# Altium footprint library Generic Footprint.PcbLib: 160 footprints (part 16 of 20) (continued)
## Symbol_FCC-Logo-6x4mm_Silkscreen [mil] (continued)
1(148.46,108.35) 1(148.73,23.48) 1(148.73,55.61) 1(148.73,140.21) 1(149,55.61) 1(149,56.14) 1(149,108.08) 1(149,108.35) 1(149,108.62) 1(149,140.74) 1(149.27,129.5) 1(149.27,130.03) 1(149.53,34.19) 1(149.53,34.46) 1(149.53,34.73) 1(149.53,108.88) 1(149.53,140.74) 1(149.8,108.35) 1(149.8,108.62) 1(149.8,109.15) 1(149.8,140.74) 1(149.8,162.16) 1(150.07,55.88) 1(150.07,140.74) 1(150.07,161.62) 1(150.07,161.89) 1(150.34,23.75) 1(150.34,55.61) 1(150.34,108.62) 1(150.34,108.88) 1(150.34,109.15) 1(150.34,140.48) 1(150.34,141.01) 1(150.34,141.28) 1(150.61,2.07) 1(150.61,2.33) 1(150.61,2.6) 1(150.61,54.81) 1(150.61,55.34) 1(150.61,109.42) 1(150.87,108.88) 1(150.87,129.77) 1(150.87,130.3) 1(151.14,33.92) 1(151.14,34.19) 1(151.14,34.46) 1(151.14,109.15) 1(151.14,109.42) 1(151.14,109.69) 1(151.14,129.77) 1(151.41,33.66) 1(151.41,54.54) 1(151.41,54.81) 1(151.41,55.07) 1(151.41,129.77) 1(151.94,109.69) 1(151.94,129.77) 1(151.94,140.74) 1(151.94,141.28) 1(151.94,141.55) 1(152.21,23.48) 1(152.21,54.27) 1(152.21,54.54) 1(152.21,109.42) 1(152.21,109.96) 1(152.21,130.57) 1(152.48,22.68) 1(152.48,23.22) 1(152.48,33.39) 1(152.48,34.19) 1(152.48,54.81) 1(152.48,109.96) 1(152.48,130.03) 1(152.48,161.89) 1(152.48,162.43) 1(152.75,1.8) 1(152.75,2.33) 1(152.75,22.68) 1(152.75,109.96) 1(153.01,2.07) 1(153.01,54) 1(153.01,109.96) 1(153.01,130.03) 1(153.28,22.68) 1(153.28,53.73) 1(153.28,54.27) 1(153.28,54.54) 1(153.55,130.03) 1(153.82,130.03) 1(153.82,130.84) 1(154.09,22.68) 1(154.09,130.57) 1(154.35,22.68) 1(154.35,53.73) 1(154.35,54) 1(154.35,54.27) 1(154.35,109.69) 1(154.35,141.28) 1(154.35,141.55) 1(154.35,141.81) 1(154.62,22.68) 1(154.62,33.12) 1(154.62,53.47) 1(154.89,22.41) 1(154.89,22.95) 1(155.42,53.47) 1(155.69,53.47) 1(155.69,109.96) 1(155.69,162.7) 1(155.96,53.47) 1(155.96,54) 1(155.96,110.22) 1(155.96,110.76) 1(156.23,162.96) 1(156.49,53.2) 1(156.49,130.57) 1(156.49,130.84) 1(156.49,131.11) 1(156.76,53.2) 1(157.03,1.26) 1(157.03,1.53) 1(157.03,1.8) 1(157.03,2.07) 1(157.3,32.85) 1(157.3,33.39) 1(157.3,53.2) 1(157.83,53.2) 1(158.1,53.2) 1(158.1,110.49) 1(158.1,110.76) 1(158.1,111.03) 1(158.37,53.73) 1(158.64,53.2) 1(158.64,141.55) 1(158.9,141.81) 1(158.9,142.08) 1(162.65,141.55) 1(162.92,141.81) 1(162.92,142.08) 1(163.19,53.2) 1(163.19,53.73) 1(163.46,53.2) 1(163.72,110.49) 1(163.72,110.76) 1(163.72,111.03) 1(163.99,32.85) 1(163.99,33.39) 1(163.99,53.2) 1(164.26,1.8) 1(164.53,1.26) 1(164.53,2.07) 1(164.53,53.2) 1(164.79,1.53) 1(164.79,53.2) 1(164.79,130.57) 1(164.79,130.84) 1(165.06,131.11) 1(165.33,53.2) 1(165.33,162.96) 1(165.6,53.47) 1(165.6,54) 1(165.6,162.7) 1(165.87,53.47) 1(165.87,110.22) 1(165.87,110.76) 1(166.13,109.96) 1(166.4,53.47) 1(166.67,22.41) 1(166.67,22.68) 1(166.67,22.95) 1(166.94,22.68) 1(166.94,33.12) 1(166.94,53.47) 1(167.2,22.68) 1(167.2,53.73) 1(167.2,54) 1(167.2,54.27) 1(167.2,141.28) 1(167.2,141.55) 1(167.2,141.81) 1(167.47,130.3) 1(167.47,130.57) 1(167.74,130.03) 1(167.74,130.84) 1(168.01,109.69) 1(168.01,130.3) 1(168.27,22.68) 1(168.27,53.73) 1(168.27,54) 1(168.27,54.27) 1(168.27,54.54) 1(168.27,130.03) 1(168.54,22.68) 1(168.81,1.8) 1(168.81,2.07) 1(168.81,2.33) 1(168.81,22.68) 1(168.81,33.39) 1(168.81,130.03) 1(168.81,161.89) 1(169.08,23.22) 1(169.08,34.19) 1(169.08,109.42) 1(169.08,109.96) 1(169.08,130.03) 1(169.08,162.43) 1(169.35,23.48) 1(169.35,54.27) 1(169.35,54.54) 1(169.35,54.81) 1(169.35,109.42) 1(169.35,130.57) 1(169.61,109.42) 1(169.61,109.96) 1(169.61,129.77) 1(169.61,140.74) 1(169.61,141.28) 1(169.61,141.55) 1(169.88,109.69) 1(169.88,129.77) 1(170.15,54.54) 1(170.15,54.81) 1(170.15,55.07) 1(170.15,129.77) 1(170.42,33.66) 1(170.42,33.92) 1(170.42,34.19) 1(170.42,34.46) 1(170.42,130.03) 1(170.68,109.15) 1(170.68,109.42) 1(170.68,109.69) 1(170.68,129.77) 1(170.68,130.03) 1(170.68,130.3) 1(170.95,23.75) 1(170.95,54.81) 1(170.95,55.07) 1(170.95,55.34) 1(170.95,55.61) 1(171.22,2.33) 1(171.22,2.6) 1(171.22,55.07) 1(171.22,140.48) 1(171.22,141.28) 1(171.22,161.62) 1(171.22,161.89) 1(171.49,2.07) 1(171.49,109.15) 1(171.49,109.42) 1(171.49,141.01) 1(171.49,162.16) 1(171.75,34.46) 1(171.75,55.88) 1(171.75,108.62) 1(172.02,34.19) 1(172.02,34.73) 1(172.02,129.5) 1(172.29,109.15) 1(172.29,130.03) 1(172.29,140.74) 1(172.56,55.61) 1(172.56,56.14) 1(172.56,108.35) 1(172.56,108.62) 1(172.56,108.88) 1(172.56,140.74) 1(172.83,23.48) 1(172.83,55.61) 1(172.83,140.21) 1(173.09,34.46) 1(173.09,34.73) 1(173.09,34.99) 1(173.09,55.88) 1(173.09,56.41) 1(173.09,108.08) 1(173.09,108.35) 1(173.09,108.62) 1(173.09,129.5) 1(173.36,2.6) 1(173.36,2.87) 1(173.36,35.26) 1(173.36,129.23) 1(173.36,129.77) 1(173.36,161.36) 1(173.36,161.62) 1(173.36,161.89) 1(173.63,2.33) 1(173.63,3.14) 1(173.63,24.02) 1(173.63,55.88) 1(173.63,56.14) 1(173.63,107.81) 1(173.63,108.35) 1(173.63,128.96) 1(173.63,161.09) 1(173.9,3.14) 1(173.9,23.48) 1(173.9,23.75) 1(173.9,56.68) 1(174.16,3.14) 1(174.16,34.73) 1(174.16,34.99) 1(174.16,35.26) 1(174.16,56.14) 1(174.16,56.68) 1(174.16,107.55) 1(174.16,128.7) 1(174.16,129.23) 1(174.16,129.5) 1(174.16,140.48) 1(174.43,35.26) 1(174.43,35.53) 1(174.43,56.41) 1(174.43,56.95) 1(174.43,107.28) 1(174.43,107.81) 1(174.43,139.94) 1(174.43,140.48) 1(174.7,56.41) 1(174.7,56.68) 1(174.7,57.22) 1(174.7,107.81) 1(174.97,3.14) 1(174.97,23.75) 1(174.97,24.29) 1(174.97,34.99) 1(174.97,35.26) 1(174.97,56.95) 1(174.97,57.48) 1(174.97,107.55) 1(174.97,140.48) 1(174.97,161.62) 1(175.24,2.6) 1(175.24,2.87) 1(175.24,24.02) 1(175.24,35.53) 1(175.24,35.8) 1(175.24,56.95) 1(175.24,57.22) 1(175.24,107.01) 1(175.24,107.28) 1(175.24,107.55) 1(175.24,128.96) 1(175.24,140.21) 1(175.24,140.48) 1(175.24,160.82) 1(175.24,161.09) 1(175.24,161.36) 1(175.5,128.43) 1(175.5,128.7) 1(175.5,128.96) 1(175.5,129.23) 1(175.5,139.67) 1(175.77,57.22) 1(175.77,57.48) 1(175.77,57.75) 1(176.04,35.26) 1(176.04,35.8) 1(176.04,57.48) 1(176.04,106.74) 1(176.04,107.01) 1(176.04,107.28) 1(176.31,24.02) 1(176.31,24.29) 1(176.31,24.82) 1(176.31,58.02) 1(176.31,58.29) 1(176.31,128.16) 1(176.31,128.43) 1(176.31,140.21) 1(176.31,161.36) 1(176.57,2.87) 1(176.57,106.48) 1(176.57,106.74) 1(176.57,107.01) 1(176.57,128.7) 1(176.57,139.4) 1(176.57,139.67) 1(176.57,139.94) 1(176.57,160.82) 1(176.84,35.53) 1(176.84,58.55) 1(176.84,105.94) 1(176.84,106.21) 1(176.84,106.48) 1(176.84,106.74) 1(176.84,160.55) 1(177.11,106.21) 1(177.11,127.89) 1(177.11,128.16) 1(177.11,161.09) 1(177.38,24.29) 1(177.38,24.55) 1(177.38,24.82) 1(177.38,25.09) 1(177.38,58.82) 1(177.38,105.67) 1(177.38,106.21) 1(177.38,106.48) 1(177.64,58.82) 1(177.64,59.09) 1(177.64,105.4) 1(177.64,127.89) 1(177.64,128.43) 1(177.64,139.14) 1(177.64,139.4) 1(177.64,139.67) 1(177.64,139.94) 1(177.91,35.8) 1(178.18,3.14) 1(178.18,58.82) 1(178.18,160.29) 1(178.18,160.55) 1(178.45,24.82) 1(178.45,25.09) 1(178.45,25.36) 1(178.45,36.07) 1(178.45,59.09) 1(178.45,59.62) 1(178.45,105.14) 1(178.45,128.16) 1(178.45,160.29) 1(178.72,36.87) 1(178.72,59.09) 1(178.72,59.36) 1(178.72,59.62) 1(178.72,59.89) 1(178.72,104.6) 1(178.72,104.87) 1(178.72,138.87) 1(178.72,139.14) 1(178.72,139.4) 1(178.98,25.09) 1(178.98,36.33) 1(178.98,59.62) 1(178.98,59.89) 1(178.98,60.16) 1(178.98,104.87) 1(178.98,160.29) 1(178.98,160.82) 1(179.25,3.4) 1(179.25,3.94) 1(179.25,25.62) 1(179.25,36.6) 1(179.25,36.87) 1(179.25,37.14) 1(179.25,60.43) 1(179.25,104.33) 1(179.25,104.6) 1(179.25,160.29) 1(179.52,59.89) 1(179.52,104.87) 1(179.52,127.09) 1(179.52,127.62) 1(179.52,127.89) 1(179.52,138.6) 1(179.52,138.87) 1(179.52,139.14) 1(179.79,60.7) 1(179.79,104.07) 1(179.79,104.33) 1(179.79,104.6) 1(180.05,25.89) 1(180.05,36.87) 1(180.05,37.4) 1(180.05,60.96) 1(180.05,103.8) 1(180.05,104.07) 1(180.05,104.33) 1(180.05,126.82) 1(180.05,127.09) 1(180.05,127.36) 1(180.32,3.94) 1(180.32,37.14) 1(180.32,60.96) 1(180.32,61.23) 1(180.32,103.26) 1(180.32,103.53) 1(180.32,103.8) 1(180.32,104.07) 1(180.32,138.07) 1(180.32,138.33) 1(180.32,138.87) 1(180.59,3.67) 1(180.59,4.21) 1(180.59,4.48) 1(180.59,61.23) 1(180.59,61.5) 1(180.59,103.8) 1(180.59,126.55) 1(180.59,126.82) 1(180.59,160.55) 1(180.86,26.16) 1(180.86,37.14) 1(180.86,37.4) 1(180.86,37.67) 1(180.86,60.96) 1(180.86,61.77) 1(180.86,102.99) 1(180.86,126.29) 1(180.86,127.09) 1(181.12,25.89) 1(181.12,37.67) 1(181.12,61.23) 1(181.12,61.5) 1(181.12,61.77) 1(181.12,62.03) 1(181.12,102.73) 1(181.39,3.94) 1(181.39,25.89) 1(181.39,61.5) 1(181.39,62.03) 1(181.39,62.3) 1(181.39,102.46) 1(181.39,102.73) 1(181.39,102.99) 1(181.39,126.82) 1(181.39,137.8) 1(181.39,160.29) 1(181.66,4.21) 1(181.66,4.48) 1(181.66,4.74) 1(181.66,26.43) 1(181.66,37.4) 1(181.66,38.21) 1(181.66,61.77) 1(181.66,62.03) 1(181.66,62.3) 1(181.66,62.57) 1(181.66,102.19) 1(181.66,102.46) 1(181.66,102.99) 1(181.66,126.02) 1(181.66,126.29) 1(181.66,126.55) 1(181.66,159.48) 1(181.93,4.21) 1(181.93,4.48) 1(181.93,26.16) 1(181.93,37.67) 1(181.93,38.21) 1(181.93,62.84) 1(181.93,101.66) 1(181.93,101.92) 1(181.93,102.46) 1(181.93,102.73) 1(181.93,126.29) 1(181.93,137.53) 1(181.93,138.07) 1(181.93,160.02) 1(182.2,4.48) 1(182.2,62.3) 1(182.2,62.57) 1(182.2,62.84) 1(182.2,63.11) 1(182.2,63.37) 1(182.2,101.92) 1(182.2,102.19) 1(182.2,125.75) 1(182.2,126.02) 1(182.2,126.55) 1(182.2,138.07) 1(182.46,4.21) 1(182.46,37.94) 1(182.46,62.57) 1(182.46,62.84) 1(182.46,63.11) 1(182.46,63.64) 1(182.46,101.39) 1(182.46,101.66) 1(182.46,102.19) 1(182.73,4.21) 1(182.73,4.74) 1(182.73,26.16) 1(182.73,26.43) 1(182.73,26.7) 1(182.73,63.11) 1(182.73,63.37) 1(182.73,63.64) 1(182.73,63.91) 1(182.73,100.59) 1(182.73,100.85) 1(182.73,101.12) 1(182.73,101.66) 1(182.73,101.92) 1(182.73,125.48) 1(182.73,137.26) 1(182.73,137.8) 1(182.73,159.22) 1(182.73,159.48) 1(182.73,159.75) 1(183,4.48) 1(183,5.01) 1(183,38.21) 1(183,38.74) 1(183,63.37) 1(183,63.64) 1(183,63.91) 1(183,64.18) 1(183,100.32) 1(183,125.75) 1(183.27,26.43) 1(183.27,26.7) 1(183.27,26.96) 1(183.27,125.48) 1(183.27,126.02) 1(183.27,137.53) 1(183.27,137.8) 1(183.53,5.01) 1(183.53,5.28) 1(183.53,38.48) 1(183.53,38.74) 1(183.53,39.01) 1(183.53,100.05) 1(183.53,100.32) 1(183.53,158.95) 1(183.53,159.22) 1(183.53,159.48) 1(183.8,4.74) 1(183.8,26.7) 1(183.8,27.23) 1(183.8,39.28) 1(183.8,125.75) 1(183.8,136.99) 1(184.07,26.96) 1(184.07,27.23) 1(184.07,27.5) 1(184.07,38.74) 1(184.07,39.28) 1(184.07,98.98) 1(184.07,99.25) 1(184.07,100.32) 1(184.07,136.73) 1(184.07,137.26) 1(184.07,137.53) 1(184.34,27.23) 1(184.34,39.01) 1(184.34,39.55) 1(184.34,99.25) 1(184.34,99.78) 1(184.34,125.48) 1(184.34,136.99) 1(184.61,26.96) 1(184.61,27.77) 1(184.61,124.68) 1(184.61,136.46) 1(184.61,136.73) 1(184.61,137.26) 1(184.87,5.01) 1(184.87,5.28) 1(184.87,39.01) 1(184.87,39.28) 1(184.87,39.55) 1(184.87,39.81) 1(184.87,99.51) 1(184.87,124.41) 1(184.87,124.68) 1(184.87,124.95) 1(184.87,125.22) 1(184.87,136.99) 1(184.87,158.68) 1(184.87,158.95) 1(184.87,159.22) 1(185.14,5.01) 1(185.14,158.41) 1(185.41,5.01) 1(185.41,28.03) 1(185.41,39.81) 1(185.41,40.08) 1(185.41,124.14) 1(185.41,124.41) 1(185.41,124.68) 1(185.41,136.19) 1(185.41,136.46) 1(185.41,136.73) 1(185.68,39.55) 1(185.68,158.41) 1(185.68,158.68) 1(185.68,158.95) 1(185.94,27.77) 1(185.94,28.3) 1(185.94,40.08) 1(185.94,40.35) 1(185.94,123.88) 1(185.94,124.14) 1(185.94,124.41) 1(185.94,135.92) 1(185.94,136.46) 1(185.94,158.14) 1(186.21,27.77) 1(186.21,39.81) 1(186.21,40.35) 1(186.21,123.88) 1(186.21,124.14) 1(186.48,5.28) 1(186.48,28.03) 1(186.48,28.57) 1(186.48,123.34) 1(186.48,158.14) 1(186.48,158.68) 1(186.75,5.55) 1(186.75,40.08) 1(186.75,123.34) 1(186.75,123.88) 1(186.75,135.66) 1(187.01,28.03) 1(187.01,28.3) 1(187.01,28.57) 1(187.01,28.84) 1(187.01,40.35) 1(187.01,41.15) 1(187.01,123.07) 1(187.01,135.39) 1(187.01,157.88) 1(187.28,40.62) 1(187.28,123.61) 1(187.28,157.88) 1(187.28,158.41) 1(187.55,5.81) 1(187.55,6.35) 1(187.55,28.3) 1(187.55,28.84) 1(187.55,41.15) 1(187.55,123.07) 1(187.55,135.12) 1(187.82,28.57) 1(187.82,29.11) 1(187.82,40.88) 1(187.82,41.42) 1(187.82,122.81) 1(187.82,123.34) 1(188.09,6.62) 1(188.09,41.69) 1(188.09,122.54) 1(188.09,122.81) 1(188.09,134.85) 1(188.09,135.39) 1(188.35,6.08) 1(188.35,6.35) 1(188.35,28.84) 1(188.35,29.11) 1(188.35,29.37) 1(188.35,41.15) 1(188.35,41.42) 1(188.35,41.96) 1(188.35,122.54) 1(188.35,122.81) 1(188.35,123.07) 1(188.35,135.12) 1(188.35,135.39) 1(188.35,158.14) 1(188.62,41.42) 1(188.62,41.69) 1(188.62,42.22) 1(188.62,122) 1(188.62,134.59) 1(188.89,29.11) 1(188.89,29.37) 1(188.89,29.64) 1(188.89,41.69) 1(188.89,41.96) 1(188.89,42.22) 1(188.89,42.49) 1(188.89,134.85) 1(188.89,135.12) 1(188.89,157.07) 1(188.89,157.34) 1(188.89,157.88) 1(189.16,6.35) 1(189.16,6.62) 1(189.16,6.88) 1(189.16,121.74) 1(189.16,122) 1(189.16,122.27) 1(189.16,122.54) 1(189.42,7.15) 1(189.42,29.37) 1(189.42,29.64) 1(189.42,29.91) 1(189.42,30.18) 1(189.42,41.96) 1(189.42,42.49) 1(189.42,121.47) 1(189.42,121.74) 1(189.42,134.05) 1(189.42,134.59) 1(189.42,134.85) 1(189.69,6.62) 1(189.69,6.88) 1(189.69,29.64) 1(189.69,42.22) 1(189.69,42.76) 1(189.69,121.47) 1(189.69,122) 1(189.69,157.07) 1(189.69,157.34) 1(189.69,157.61) 1(189.96,7.15) 1(189.96,7.42) 1(189.96,42.76) 1(189.96,121.2) 1(189.96,121.74) 1(189.96,133.78) 1(189.96,134.05) 1(189.96,134.59) 1(189.96,156.81) 1(190.23,30.44) 1(190.23,42.49) 1(190.23,43.03) 1(190.23,121.2) 1(190.23,134.32) 1(190.23,157.34) 1(190.49,6.88) 1(190.49,7.42) 1(190.49,30.71) 1(190.49,42.76) 1(190.49,43.03) 1(190.49,43.29) 1(190.49,43.56) 1(190.49,121.47) 1(190.49,156.81) 1(190.76,7.69) 1(190.76,43.03) 1(190.76,43.29) 1(190.76,43.56) 1(190.76,43.83) 1(190.76,121.2) 1(190.76,133.51) 1(190.76,134.05) 1(190.76,156.54) 1(190.76,157.07) 1(191.03,7.15) 1(191.03,30.44) 1(191.03,43.29) 1(191.03,120.93) 1(191.03,133.25) 1(191.3,7.69) 1(191.3,30.71) 1(191.3,30.98) 1(191.3,43.56) 1(191.3,43.83) 1(191.3,44.1) 1(191.3,132.98) 1(191.3,156.27) 1(191.3,156.54) 1(191.3,156.81) 1(191.57,7.96) 1(191.57,30.44) 1(191.57,30.71) 1(191.57,31.25) 1(191.57,119.86) 1(191.57,120.13) 1(191.57,120.66) 1(191.83,30.98) 1(191.83,31.25) 1(191.83,31.51) 1(191.83,43.83) 1(191.83,44.1) 1(191.83,44.36) 1(191.83,119.59) 1(191.83,119.86) 1(191.83,120.13) 1(191.83,120.4) 1(192.1,7.42) 1(192.1,7.96) 1(192.1,44.1) 1(192.1,44.36) 1(192.1,119.59) 1(192.1,120.13) 1(192.1,132.44) 1(192.1,132.71) 1(192.1,132.98) 1(192.1,156) 1(192.1,156.27) 1(192.37,30.98) 1(192.37,31.25) 1(192.37,31.51) 1(192.37,31.78) 1(192.37,44.36) 1(192.37,119.06) 1(192.37,119.86) 1(192.37,132.71) 1(192.37,132.98) 1(192.37,156.54) 1(192.64,7.69) 1(192.64,44.63) 1(192.64,119.59) 1(192.64,156) 1(192.9,118.79) 1(192.9,132.18) 1(192.9,132.71) 1(193.17,7.96) 1(193.17,31.51) 1(193.17,31.78) 1(193.17,32.05) 1(193.17,32.32) 1(193.17,44.9) 1(193.17,118.79) 1(193.17,119.06) 1(193.17,119.33) 1(193.17,131.91) 1(193.17,132.18) 1(193.17,132.44) 1(193.17,156.27) 1(193.44,8.22) 1(193.44,8.76) 1(193.44,31.78) 1(193.44,32.05) 1(193.44,45.17) 1(193.44,119.06) 1(193.44,132.44) 1(193.44,156) 1(193.71,32.05) 1(193.71,32.59) 1(193.71,45.44) 1(193.71,118.79) 1(193.71,131.64) 1(193.71,132.18) 1(193.98,32.85) 1(193.98,46.24) 1(193.98,117.72) 1(193.98,117.99) 1(193.98,131.37) 1(194.24,8.49) 1(194.24,8.76) 1(194.24,9.03) 1(194.24,33.12) 1(194.24,45.7) 1(194.24,45.97) 1(194.24,46.24) 1(194.24,46.51) 1(194.24,117.45) 1(194.24,117.99) 1(194.24,118.25) 1(194.24,118.52) 1(194.24,131.11) 1(194.24,155.2) 1(194.24,155.74) 1(194.51,46.24) 1(194.51,46.51) 1(194.51,46.77) 1(194.51,117.18) 1(194.51,117.72) 1(194.51,117.99) 1(194.51,155.2) 1(194.78,8.76) 1(194.78,9.03) 1(194.78,9.29) 1(194.78,32.85) 1(194.78,33.39) 1(194.78,46.51) 1(194.78,46.77) 1(194.78,47.04) 1(194.78,116.92) 1(194.78,117.18) 1(194.78,117.45) 1(194.78,117.72) 1(194.78,130.84) 1(194.78,154.93) 1(194.78,155.47) 1(195.05,32.85) 1(195.05,33.12) 1(195.05,33.66) 1(195.05,46.77) 1(195.05,47.04) 1(195.05,63.91) 1(195.05,64.18) 1(195.05,64.44) 1(195.05,116.65) 1(195.05,116.92) 1(195.05,117.45) 1(195.05,130.57) 1(195.31,9.03) 1(195.31,9.29) 1(195.31,9.56) 1(195.31,33.12) 1(195.31,33.39) 1(195.31,116.38) 1(195.31,116.65) 1(195.31,117.18) 1(195.31,154.66) 1(195.31,154.93) 1(195.31,155.2) 1(195.58,9.83) 1(195.58,33.66) 1(195.58,33.92) 1(195.58,47.04) 1(195.58,47.31) 1(195.58,116.38) 1(195.58,116.92) 1(195.58,130.3) 1(195.58,154.4) 1(195.85,9.29) 1(195.85,9.83) 1(195.85,33.39) 1(195.85,33.66) 1(195.85,34.19) 1(195.85,47.58) 1(195.85,48.11) 1(195.85,116.65) 1(195.85,130.03) 1(195.85,154.93) 1(196.12,9.56) 1(196.12,10.1) 1(196.12,33.92) 1(196.12,34.46) 1(196.12,47.85) 1(196.12,48.11) 1(196.12,48.38) 1(196.12,115.58) 1(196.12,116.38) 1(196.12,129.77) 1(196.12,130.03) 1(196.12,130.3) 1(196.12,154.13) 1(196.12,154.4) 1(196.12,154.66) 1(196.38,9.56) 1(196.38,33.92) 1(196.38,34.19) 1(196.38,48.11) 1(196.38,48.38) 1(196.38,48.65) 1(196.38,48.92) 1(196.38,115.31) 1(196.38,116.11) 1(196.38,130.3) 1(196.38,154.66) 1(196.65,10.1) 1(196.65,10.36) 1(196.65,34.73) 1(196.65,48.65) 1(196.65,115.04) 1(196.65,115.58) 1(196.65,115.85) 1(196.65,129.5) 1(196.65,129.77) 1(196.65,130.03) 1(196.65,153.86) 1(196.65,154.13) 1(196.65,154.4) 1(196.92,9.83) 1(196.92,10.36) 1(196.92,34.19) 1(196.92,34.46) 1(196.92,48.38) 1(196.92,48.65) 1(196.92,48.92) 1(196.92,49.18) 1(196.92,49.45) 1(196.92,114.77) 1(196.92,115.31) 1(196.92,115.58) 1(196.92,129.23) 1(197.19,34.46) 1(197.19,34.99) 1(197.19,48.92) 1(197.19,49.18) 1(197.19,114.51) 1(197.19,115.04) 1(197.19,115.31) 1(197.19,128.96) 1(197.19,129.5) 1(197.19,129.77) 1(197.19,153.59) 1(197.19,153.86) 1(197.46,35.26) 1(197.46,35.53) 1(197.46,49.18) 1(197.46,49.45) 1(197.46,49.72) 1(197.46,49.99) 1(197.46,114.51) 1(197.46,114.77) 1(197.46,115.04) 1(197.46,128.7) 1(197.46,129.5) 1(197.46,154.13) 1(197.72,10.1) 1(197.72,35.26) 1(197.72,49.45) 1(197.72,49.72) 1(197.72,49.99) 1(197.72,114.77) 1(197.72,153.59) 1(197.99,35.8) 1(197.99,114.51) 1(197.99,128.43) 1(198.26,10.36) 1(198.26,10.9) 1(198.26,11.17) 1(198.26,35.26) 1(198.26,49.72) 1(198.26,49.99) 1(198.26,50.25) 1(198.26,50.79) 1(198.26,114.24) 1(198.26,128.16) 1(198.26,153.86) 1(198.53,36.07) 1(198.53,50.52) 1(198.53,50.79) 1(198.53,51.06) 1(198.53,51.33) 1(198.53,113.17) 1(198.53,113.7) 1(198.53,113.97) 1(198.53,127.89) 1(198.53,128.43) 1(198.79,10.63) 1(198.79,10.9) 1(198.79,11.17) 1(198.79,11.44) 1(198.79,36.07) 1(198.79,36.33) 1(198.79,50.79) 1(198.79,51.06) 1(198.79,51.59) 1(198.79,51.86) 1(198.79,112.36) 1(198.79,112.63) 1(198.79,113.17) 1(198.79,113.44) 1(198.79,128.16) 1(198.79,128.43) 1(198.79,153.59) 1(199.06,10.9) 1(199.06,36.07) 1(199.06,36.33) 1(199.06,36.6) 1(199.06,36.87) 1(199.06,51.06) 1(199.06,51.33) 1(199.06,51.59) 1(199.06,52.13) 1(199.06,112.63) 1(199.06,113.17) 1(199.06,127.62) 1(199.06,152.79) 1(199.06,153.33) 1(199.33,11.44) 1(199.33,36.33) 1(199.33,37.14) 1(199.33,51.33) 1(199.33,112.1) 1(199.33,112.9) 1(199.33,127.62) 1(199.33,128.16) 1(199.33,152.79) 1(199.6,11.17) 1(199.6,11.7) 1(199.6,51.59) 1(199.6,52.13) 1(199.6,52.4) 1(199.6,112.1) 1(199.6,112.63) 1(199.6,127.09) 1(199.6,127.36) 1(199.6,152.52) 1(199.6,153.06) 1(199.87,52.13) 1(199.87,52.4) 1(199.87,52.66) 1(199.87,52.93) 1(199.87,111.29) 1(199.87,112.1) 1(199.87,127.36) 1(199.87,127.62) 1(199.87,152.25) 1(199.87,152.52) 1(200.13,11.44) 1(200.13,11.7) 1(200.13,11.97) 1(200.13,37.4) 1(200.13,52.4) 1(200.13,52.66) 1(200.13,52.93) 1(200.13,111.29) 1(200.13,111.83) 1(200.13,126.82) 1(200.13,127.09) 1(200.13,127.36) 1(200.13,151.99) 1(200.13,152.25) 1(200.13,152.52) 1(200.13,152.79) 1(200.4,37.67) 1(200.4,52.66) 1(200.4,52.93) 1(200.4,53.2) 1(200.4,53.73) 1(200.4,110.49) 1(200.4,111.03) 1(200.4,111.29) 1(200.4,111.56) 1(200.4,126.29) 1(200.4,126.55) 1(200.4,126.82) 1(200.4,127.09) 1(200.4,151.72) 1(200.67,11.7) 1(200.67,11.97) 1(200.67,12.24) 1(200.67,37.94) 1(200.67,110.22) 1(200.67,126.02) 1(200.67,126.55) 1(200.67,126.82) 1(200.94,11.97) 1(200.94,12.24) 1(200.94,37.67) 1(200.94,37.94) 1(200.94,38.21) 1(200.94,53.47) 1(200.94,53.73) 1(200.94,54.27) 1(200.94,54.54) 1(200.94,109.96) 1(200.94,110.22) 1(200.94,110.49) 1(200.94,110.76) 1(200.94,125.75) 1(200.94,126.29) 1(200.94,126.55) 1(200.94,151.45) 1(200.94,151.99) 1(200.94,152.25) 1(201.2,37.67) 1(201.2,37.94) 1(201.2,38.21) 1(201.2,38.48) 1(201.2,53.73) 1(201.2,54.27) 1(201.2,54.81) 1(201.2,55.07) 1(201.2,109.15) 1(201.2,109.42) 1(201.2,109.69) 1(201.2,109.96) 1(201.2,110.49) 1(201.2,125.48) 1(201.2,126.02) 1(201.2,126.29) 1(201.2,151.72) 1(201.47,38.21) 1(201.47,38.48) 1(201.47,38.74) 1(201.47,54) 1(201.47,54.27) 1(201.47,54.54) 1(201.47,54.81) 1(201.47,55.07) 1(201.47,55.34) 1(201.47,108.88) 1(201.47,109.15) 1(201.47,109.42) 1(201.47,109.96) 1(201.47,110.22) 1(201.47,125.75) 1(201.47,126.02) 1(201.47,151.45) 1(201.47,151.99) 1(201.74,12.24) 1(201.74,38.48) 1(201.74,39.01) 1(201.74,54.54) 1(201.74,54.81) 1(201.74,55.07) 1(201.74,55.34) 1(201.74,55.61) 1(201.74,55.88) 1(201.74,108.35) 1(201.74,108.62) 1(201.74,109.15) 1(201.74,109.42) 1(201.74,125.22) 1(201.74,125.48) 1(201.74,125.75) 1(201.74,151.18) 1(201.74,151.72) 1(202.01,12.51) 1(202.01,39.28) 1(202.01,55.34) 1(202.01,124.68) 1(202.01,124.95) 1(202.01,125.22) 1(202.01,125.48) 1(202.01,151.18) 1(202.27,13.04) 1(202.27,39.55) 1(202.27,55.61) 1(202.27,55.88) 1(202.27,56.14) 1(202.27,56.41) 1(202.27,107.81) 1(202.27,108.08) 1(202.27,108.35) 1(202.27,124.41) 1(202.27,124.95) 1(202.27,125.22) 1(202.27,151.45) 1(202.54,12.77) 1(202.54,13.04) 1(202.54,13.31) 1(202.54,39.55) 1(202.54,39.81) 1(202.54,55.61) 1(202.54,55.88) 1(202.54,56.14) 1(202.54,56.41) 1(202.54,56.68) 1(202.54,107.28) 1(202.54,107.55) 1(202.54,107.81) 1(202.54,108.35) 1(202.54,124.68) 1(202.54,124.95) 1(202.81,13.04) 1(202.81,13.31) 1(202.81,13.58) 1(202.81,39.55) 1(202.81,39.81) 1(202.81,40.08) 1(202.81,56.14) 1(202.81,56.41) 1(202.81,107.28) 1(202.81,107.55) 1(202.81,124.14) 1(202.81,124.41) 1(202.81,124.68) 1(202.81,151.18) 1(203.08,13.85) 1(203.08,39.81) 1(203.08,40.08) 1(203.08,40.35) 1(203.08,58.29) 1(203.08,58.55) 1(203.08,107.28) 1(203.08,107.55) 1(203.08,107.81) 1(203.08,123.61) 1(203.08,123.88) 1(203.08,124.14) 1(203.08,124.41) 1(203.08,150.92) 1(203.35,40.35) 1(203.35,40.62) 1(203.35,56.95) 1(203.35,57.48) 1(203.35,105.67) 1(203.35,105.94) 1(203.35,106.74) 1(203.35,123.34) 1(203.35,123.88) 1(203.35,124.14) 1(203.35,150.11) 1(203.61,13.31) 1(203.61,13.58) 1(203.61,13.85) 1(203.61,14.11) 1(203.61,40.08) 1(203.61,40.62) 1(203.61,40.88) 1(203.61,57.22) 1(203.61,58.82) 1(203.61,105.4) 1(203.61,106.21) 1(203.61,107.01) 1(203.61,123.07) 1(203.61,123.61) 1(203.61,123.88) 1(203.61,150.65) 1(203.88,13.58) 1(203.88,14.11) 1(203.88,14.38) 1(203.88,40.35) 1(203.88,40.62) 1(203.88,40.88) 1(203.88,41.15) 1(203.88,57.75) 1(203.88,58.02) 1(203.88,59.09) 1(203.88,59.36) 1(203.88,104.6) 1(203.88,104.87) 1(203.88,105.14) 1(203.88,105.67) 1(203.88,106.48) 1(203.88,122.81) 1(203.88,123.34) 1(203.88,123.61) 1(203.88,149.85) 1(203.88,150.11) 1(203.88,150.38) 1(204.15,13.85) 1(204.15,40.88) 1(204.15,41.15) 1(204.15,41.42) 1(204.15,59.09) 1(204.15,59.36) 1(204.15,59.62) 1(204.15,59.89) 1(204.15,104.33) 1(204.15,104.87) 1(204.15,105.14) 1(204.15,105.67) 1(204.15,123.07) 1(204.15,123.34) 1(204.42,14.38) 1(204.42,14.65) 1(204.42,41.15) 1(204.42,41.69) 1(204.42,59.09) 1(204.42,59.36) 1(204.42,59.89) 1(204.42,60.43) 1(204.42,103.8) 1(204.42,104.33) 1(204.42,104.87) 1(204.42,105.14) 1(204.42,122.54) 1(204.42,122.81) 1(204.42,123.07) 1(204.42,149.58) 1(204.42,149.85) 1(204.42,150.11) 1(204.68,14.11) 1(204.68,41.96) 1(204.68,60.16) 1(204.68,60.43) 1(204.68,103.8) 1(204.68,104.07) 1(204.68,122) 1(204.68,122.27) 1(204.68,122.81) 1(204.68,149.31) 1(204.68,149.58) 1(204.68,149.85) 1(204.95,14.65) 1(204.95,42.22) 1(204.95,59.89) 1(204.95,104.33) 1(204.95,121.74) 1(204.95,122.27) 1(204.95,149.04) 1(205.22,14.38) 1(205.22,42.22) 1(205.22,42.49) 1(205.22,60.43) 1(205.22,60.7) 1(205.22,62.3) 1(205.22,62.57) 1(205.22,101.92) 1(205.22,103.26) 1(205.22,103.53) 1(205.22,103.8) 1(205.22,121.47) 1(205.22,122) 1(205.22,122.27) 1(205.22,149.31) 1(205.49,42.22) 1(205.49,42.49) 1(205.49,42.76) 1(205.49,60.96) 1(205.49,61.23) 1(205.49,61.5) 1(205.49,62.3) 1(205.49,62.57) 1(205.49,63.11) 1(205.49,101.12) 1(205.49,101.92) 1(205.49,102.99) 1(205.49,121.74) 1(205.49,122) 1(205.49,149.04) 1(205.49,149.31) 1(205.49,149.58) 1(205.75,14.65) 1(205.75,43.56) 1(205.75,61.77) 1(205.75,62.03) 1(205.75,62.3) 1(205.75,63.11) 1(205.75,63.37) 1(205.75,63.64) 1(205.75,100.05) 1(205.75,100.32) 1(205.75,100.59) 1(205.75,101.12) 1(205.75,101.92) 1(205.75,102.19) 1(205.75,102.46) 1(205.75,102.73) 1(205.75,121.2) 1(205.75,121.47) 1(205.75,121.74) 1(206.02,14.92) 1(206.02,42.49) 1(206.02,43.03) 1(206.02,43.29) 1(206.02,43.83) 1(206.02,62.57) 1(206.02,62.84) 1(206.02,63.91) 1(206.02,100.85) 1(206.02,101.39) 1(206.02,101.66) 1(206.02,120.93) 1(206.02,121.47) 1(206.29,15.18) 1(206.29,15.72) 1(206.29,43.56) 1(206.29,63.11) 1(206.29,63.64) 1(206.29,63.91) 1(206.29,99.51) 1(206.29,99.78) 1(206.29,100.32) 1(206.29,100.59) 1(206.29,101.12) 1(206.29,120.13) 1(206.29,120.4) 1(206.29,120.66) 1(206.29,149.04) 1(206.56,15.72) 1(206.56,15.99) 1(206.56,43.56) 1(206.56,44.1) 1(206.56,63.64) 1(206.56,63.91) 1(206.56,99.51) 1(206.56,99.78) 1(206.56,100.32) 1(206.56,100.59) 1(206.56,120.4) 1(206.56,148.24) 1(206.56,148.77) 1(206.83,15.45) 1(206.83,15.99) 1(206.83,44.36) 1(206.83,64.44) 1(206.83,99.51) 1(206.83,99.78) 1(206.83,119.86) 1(206.83,120.13) 1(206.83,120.4) 1(206.83,147.97) 1(206.83,148.24) 1(207.09,15.72) 1(207.09,16.25) 1(207.09,44.36) 1(207.09,45.17) 1(207.09,98.98) 1(207.09,119.33) 1(207.09,119.59) 1(207.09,120.13) 1(207.09,147.7) 1(207.09,147.97) 1(207.09,148.51) 1(207.36,16.52) 1(207.36,44.36) 1(207.36,45.44) 1(207.36,119.59) 1(207.36,147.44) 1(207.36,147.7) 1(207.36,147.97) 1(207.36,148.24) 1(207.63,15.99) 1(207.63,16.25) 1(207.63,16.79) 1(207.63,44.63) 1(207.63,45.17) 1(207.63,118.52) 1(207.63,118.79) 1(207.63,119.33) 1(207.63,119.59) 1(207.63,147.17) 1(207.63,147.44) 1(207.63,147.7) 1(207.9,16.25) 1(207.9,16.52) 1(207.9,16.79) 1(207.9,17.06) 1(207.9,44.9) 1(207.9,45.44) 1(207.9,45.7) 1(207.9,118.79) 1(207.9,119.33) 1(208.16,16.52) 1(208.16,45.17) 1(208.16,117.72) 1(208.16,117.99) 1(208.16,118.25) 1(208.16,118.79) 1(208.16,119.06) 1(208.16,146.9) 1(208.16,147.17) 1(208.43,17.06) 1(208.43,17.33) 1(208.43,117.45) 1(208.43,147.44) 1(208.7,16.79) 1(208.7,117.72) 1(208.7,146.63) 1(208.7,146.9) 1(208.7,147.17) 1(208.97,17.06) 1(208.97,17.33) 1(209.24,17.33) 1(209.24,146.63) 1(209.24,146.9) 1(209.5,18.13) 1(209.5,145.83) 1(209.5,146.63) 1(209.77,17.59) 1(209.77,18.13) 1(209.77,18.4) 1(209.77,146.36) 1(210.04,17.86) 1(210.04,145.83) 1(210.31,18.13) 1(210.31,18.4) 1(210.31,18.66) 1(210.31,145.29) 1(210.31,145.56) 1(210.31,146.1) 1(210.57,18.4) 1(210.57,18.66) 1(210.57,18.93) 1(210.57,145.29) 1(210.57,145.56) 1(210.57,145.83) 1(210.84,19.2) 1(210.84,145.56) 1(211.11,18.66) 1(211.11,18.93) 1(211.11,19.2) 1(211.11,144.49) 1(211.11,145.29) 1(211.38,18.93) 1(211.38,145.03) 1(211.64,19.2) 1(211.64,144.22) 1(211.64,144.49) 1(211.91,19.47) 1(211.91,144.76) 1(212.18,20) 1(212.18,144.22) 1(212.18,144.49) 1(212.45,20) 1(212.45,20.27) 1(212.45,144.22) 1(212.72,19.73) 1(212.72,20.27) 1(212.72,20.54) 1(212.72,143.42) 1(212.98,20) 1(212.98,20.54) 1(212.98,20.81) 1(212.98,143.15) 1(213.25,20.27) 1(213.25,20.54) 1(213.25,20.81) 1(213.25,21.07) 1(213.25,21.34) 1(213.25,142.88) 1(213.25,143.42) 1(213.25,143.69) 1(213.25,143.96) 1(213.52,20.81) 1(213.52,21.07) 1(213.52,142.62) 1(213.52,143.15) 1(213.52,143.42) 1(213.79,21.07) 1(213.79,21.34) 1(213.79,142.88) 1(213.79,143.15) 1(214.05,142.62) 1(214.05,142.88) 1(214.32,141.81) 1(214.32,142.62) 1(214.59,21.34) 1(214.59,141.81) 1(214.59,142.35) 1(214.86,21.61) 1(214.86,21.88) 1(214.86,22.41) 1(214.86,22.68) 1(214.86,142.08) 1(215.12,22.41) 1(215.12,141.81) 1(215.39,22.14) 1(215.39,22.68) 1(215.39,22.95) 1(215.66,22.41) 1(215.66,22.95) 1(215.66,23.22) 1(215.66,23.48) 1(215.66,140.74) 1(215.66,141.01) 1(215.93,22.68) 1(215.93,23.22) 1(215.93,23.75) 1(215.93,140.48) 1(215.93,141.01) 1(215.93,141.28) 1(215.93,141.55) 1(216.2,22.95) 1(216.2,23.22) 1(216.2,23.48) 1(216.2,140.21) 1(216.2,140.48) 1(216.2,140.74) 1(216.2,141.01) 1(216.46,23.48) 1(216.46,23.75) 1(216.46,24.02) 1(216.46,140.74) 1(216.73,24.02) 1(216.73,140.21) 1(216.73,140.48) 1(217,23.75) 1(217.27,24.02) 1(217.27,24.82) 1(217.27,139.14) 1(217.27,139.4) 1(217.27,140.21) 1(217.53,24.29) 1(217.53,24.55) 1(217.53,24.82) 1(217.53,25.09) 1(217.53,25.36) 1(217.53,138.87) 1(217.53,139.4) 1(217.53,139.67) 1(217.53,139.94) 1(217.8,25.09) 1(217.8,25.62) 1(217.8,138.6) 1(217.8,139.14) 1(217.8,139.4) 1(218.07,24.82) 1(218.07,25.36) 1(218.07,138.87) 1(218.07,139.14) 1(218.34,25.09) 1(218.34,25.62) 1(218.34,25.89) 1(218.34,138.07) 1(218.34,138.33) 1(218.34,138.6) 1(218.34,138.87) 1(218.61,25.36) 1(218.61,25.89) 1(218.61,26.16) 1(218.61,26.43) 1(218.61,137.8) 1(218.61,138.33) 1(218.61,138.6) 1(218.87,25.62) 1(218.87,25.89) 1(218.87,26.16) 1(218.87,137.53) 1(218.87,137.8) 1(218.87,138.07) 1(218.87,138.33) 1(219.14,26.43) 1(219.14,137.53) 1(219.14,138.07) 1(219.41,26.16) 1(219.41,137.8) 1(219.68,26.43) 1(219.68,27.23) 1(219.68,136.73) 1(219.68,136.99) 1(219.94,26.7) 1(219.94,27.23) 1(219.94,27.5) 1(219.94,27.77) 1(219.94,136.19) 1(219.94,136.46) 1(219.94,136.73) 1(219.94,136.99) 1(219.94,137.53) 1(220.21,26.96) 1(220.21,27.5) 1(220.21,28.03) 1(220.21,135.92) 1(220.21,136.19) 1(220.21,136.99) 1(220.21,137.26) 1(220.48,27.23) 1(220.48,27.77) 1(220.48,135.66) 1(220.48,136.73) 1(220.75,27.5) 1(220.75,28.03) 1(220.75,28.3) 1(220.75,135.39) 1(220.75,135.92) 1(220.75,136.19) 1(221.01,27.77) 1(221.01,28.3) 1(221.01,28.57) 1(221.01,135.12) 1(221.01,135.39) 1(221.01,135.66) 1(221.01,135.92) 1(221.28,28.03) 1(221.28,28.57) 1(221.28,134.85) 1(221.28,135.66) 1(221.55,28.3) 1(221.55,28.57) 1(221.55,134.85) 1(221.55,135.12) 1(221.55,135.39) 1(221.82,28.84) 1(221.82,29.11) 1(221.82,29.64) 1(221.82,134.32) 1(221.82,135.12) 1(222.09,29.64) 1(222.09,29.91) 1(222.09,134.05) 1(222.35,29.37) 1(222.35,29.91) 1(222.35,30.18) 1(222.35,133.51) 1(222.35,133.78) 1(222.35,134.32) 1(222.35,134.85) 1(222.62,29.64) 1(222.62,29.91) 1(222.62,30.18) 1(222.62,30.44) 1(222.62,30.71) 1(222.62,133.25) 1(222.62,133.51) 1(222.62,134.32) 1(222.62,134.59) 1(222.89,30.18) 1(222.89,30.44) 1(222.89,30.98) 1(222.89,132.98) 1(222.89,133.25) 1(223.16,30.44) 1(223.16,30.98) 1(223.16,132.71) 1(223.16,132.98) 1(223.16,133.51) 1(223.42,30.98) 1(223.42,132.44) 1(223.42,132.71) 1(223.42,133.25) 1(223.69,31.25) 1(223.69,31.78) 1(223.69,132.44) 1(223.69,132.98) 1(223.96,31.51) 1(223.96,31.78) 1(223.96,32.05) 1(223.96,131.91) 1(223.96,132.44) 1(223.96,132.71) 1(224.23,31.78) 1(224.23,32.05) 1(224.23,131.37) 1(224.23,131.64) 1(224.23,131.91) 1(224.23,132.18) 1(224.49,32.05) 1(224.49,32.32) 1(224.49,32.59) 1(224.49,33.12) 1(224.49,131.37) 1(224.49,131.64) 1(224.49,131.91) 1(224.76,130.84) 1(224.76,131.11) 1(224.76,131.64) 1(225.03,32.85) 1(225.03,33.12) 1(225.03,33.39) 1(225.03,33.66) 1(225.03,131.37) 1(225.3,33.12) 1(225.3,33.39) 1(225.3,33.66) 1(225.3,33.92) 1(225.3,34.19) 1(225.3,129.77) 1(225.3,130.03) 1(225.57,33.39) 1(225.57,33.66) 1(225.57,34.19) 1(225.57,34.46) 1(225.57,129.5) 1(225.57,130.03) 1(225.57,130.57) 1(225.83,34.73) 1(225.83,129.23) 1(225.83,129.5) 1(225.83,130.03) 1(225.83,130.3) 1(226.1,34.19) 1(226.1,34.46) 1(226.1,34.73) 1(226.1,129.23) 1(226.37,34.46) 1(226.37,35.26) 1(226.37,35.53) 1(226.37,128.7) 1(226.37,129.5) 1(226.64,34.73) 1(226.64,34.99) 1(226.64,35.26) 1(226.64,35.53) 1(226.64,35.8) 1(226.64,36.07) 1(226.64,127.89) 1(226.64,128.16) 1(226.64,128.43) 1(226.64,128.7) 1(226.64,129.23) 1(226.9,35.26) 1(226.9,35.8) 1(226.9,36.33) 1(226.9,127.62) 1(226.9,127.89) 1(226.9,128.16) 1(226.9,128.7) 1(226.9,128.96) 1(227.17,35.53) 1(227.17,35.8) 1(227.17,36.07) 1(227.17,36.33) 1(227.17,127.09) 1(227.17,127.36) 1(227.17,127.62) 1(227.44,36.07) 1(227.44,36.6) 1(227.44,36.87) 1(227.44,127.62) 1(227.44,127.89) 1(227.44,128.16) 1(227.71,36.33) 1(227.71,37.14) 1(227.71,37.4) 1(227.71,126.55) 1(227.71,126.82) 1(227.71,127.09) 1(227.71,127.36) 1(227.98,37.14) 1(227.98,37.4) 1(227.98,37.67) 1(227.98,126.02) 1(227.98,126.29) 1(227.98,126.55) 1(227.98,127.09) 1(227.98,127.36) 1(228.24,37.14) 1(228.24,37.4) 1(228.24,37.67) 1(228.24,126.02) 1(228.24,126.29) 1(228.51,37.67) 1(228.51,126.02) 1(228.51,126.29) 1(228.51,126.55) 1(228.78,37.94) 1(228.78,39.01) 1(228.78,45.97) 1(228.78,124.95) 1(229.05,38.21) 1(229.05,38.48) 1(229.05,39.01) 1(229.05,45.44) 1(229.05,46.24) 1(229.05,124.41) 1(229.05,124.68) 1(229.05,124.95) 1(229.05,125.75) 1(229.31,38.74) 1(229.31,39.55) 1(229.31,39.81) 1(229.31,40.08) 1(229.31,45.7) 1(229.31,123.88) 1(229.31,124.14) 1(229.31,124.41) 1(229.31,124.68) 1(229.31,124.95) 1(229.31,125.22) 1(229.31,125.48) 1(229.58,39.01) 1(229.58,39.28) 1(229.58,39.81) 1(229.58,40.35) 1(229.58,40.62) 1(229.58,123.34) 1(229.58,123.61) 1(229.58,123.88) 1(229.58,124.68) 1(229.85,40.62) 1(229.85,40.88) 1(229.85,41.15) 1(229.85,122.81) 1(229.85,123.07) 1(229.85,123.88) 1(229.85,124.41) 1(230.12,39.81) 1(230.12,123.34) 1(230.38,40.62) 1(230.38,41.15) 1(230.38,41.42) 1(230.38,122.54) 1(230.38,123.07) 1(230.38,123.34) 1(230.65,41.15) 1(230.65,41.42) 1(230.65,122.54) 1(230.65,123.07) 1(230.92,41.42) 1(230.92,41.69) 1(230.92,122) 1(230.92,122.27) 1(230.92,122.54) 1(231.19,41.96) 1(231.19,42.22) 1(231.19,43.29) 1(231.19,120.4) 1(231.19,120.66) 1(231.19,121.74) 1(231.46,42.49) 1(231.46,42.76) 1(231.46,43.56) 1(231.46,121.47) 1(231.72,43.29) 1(231.72,43.56) 1(231.72,43.83) 1(231.72,44.1) 1(231.72,119.59) 1(231.72,119.86) 1(231.72,120.13) 1(231.72,120.4) 1(231.72,120.93) 1(231.72,121.2) 1(231.99,43.03) 1(231.99,43.29) 1(231.99,43.56) 1(231.99,44.1) 1(231.99,44.36) 1(231.99,44.63) 1(231.99,44.9) 1(231.99,119.06) 1(231.99,119.33) 1(231.99,119.86) 1(231.99,120.4) 1(232.26,44.1) 1(232.26,44.36) 1(232.26,44.63) 1(232.26,45.17) 1(232.26,118.52) 1(232.26,118.79) 1(232.26,119.33) 1(232.26,119.86) 1(232.53,44.36) 1(232.53,44.63) 1(232.53,45.17) 1(232.53,118.25) 1(232.53,118.52) 1(232.53,118.79) 1(232.53,119.33) 1(232.79,118.25) 1(233.06,45.17) 1(233.06,45.44) 1(233.06,45.7) 1(233.06,118.25) 1(233.06,118.52) 1(233.06,118.79) 1(233.33,45.7) 1(233.33,45.97) 1(233.33,117.99) 1(233.6,46.24) 1(233.6,117.45)
Top Overlay:
  drawing of 4310 lines, arcs and shapes, not listed